# Altium footprint library Pcblib.PcbLib: 281 footprints (part 15 of 18)
Each footprint in its own frame and in the unit in brackets; x right, y up, seen from the top. Pads: shape width x height; smd on the part's side, far side on the other; paste and mask are expansions set on the pad; w line width, h text height; cw(c..) or ccw(c..) is an arc to the next point about the centre after c.
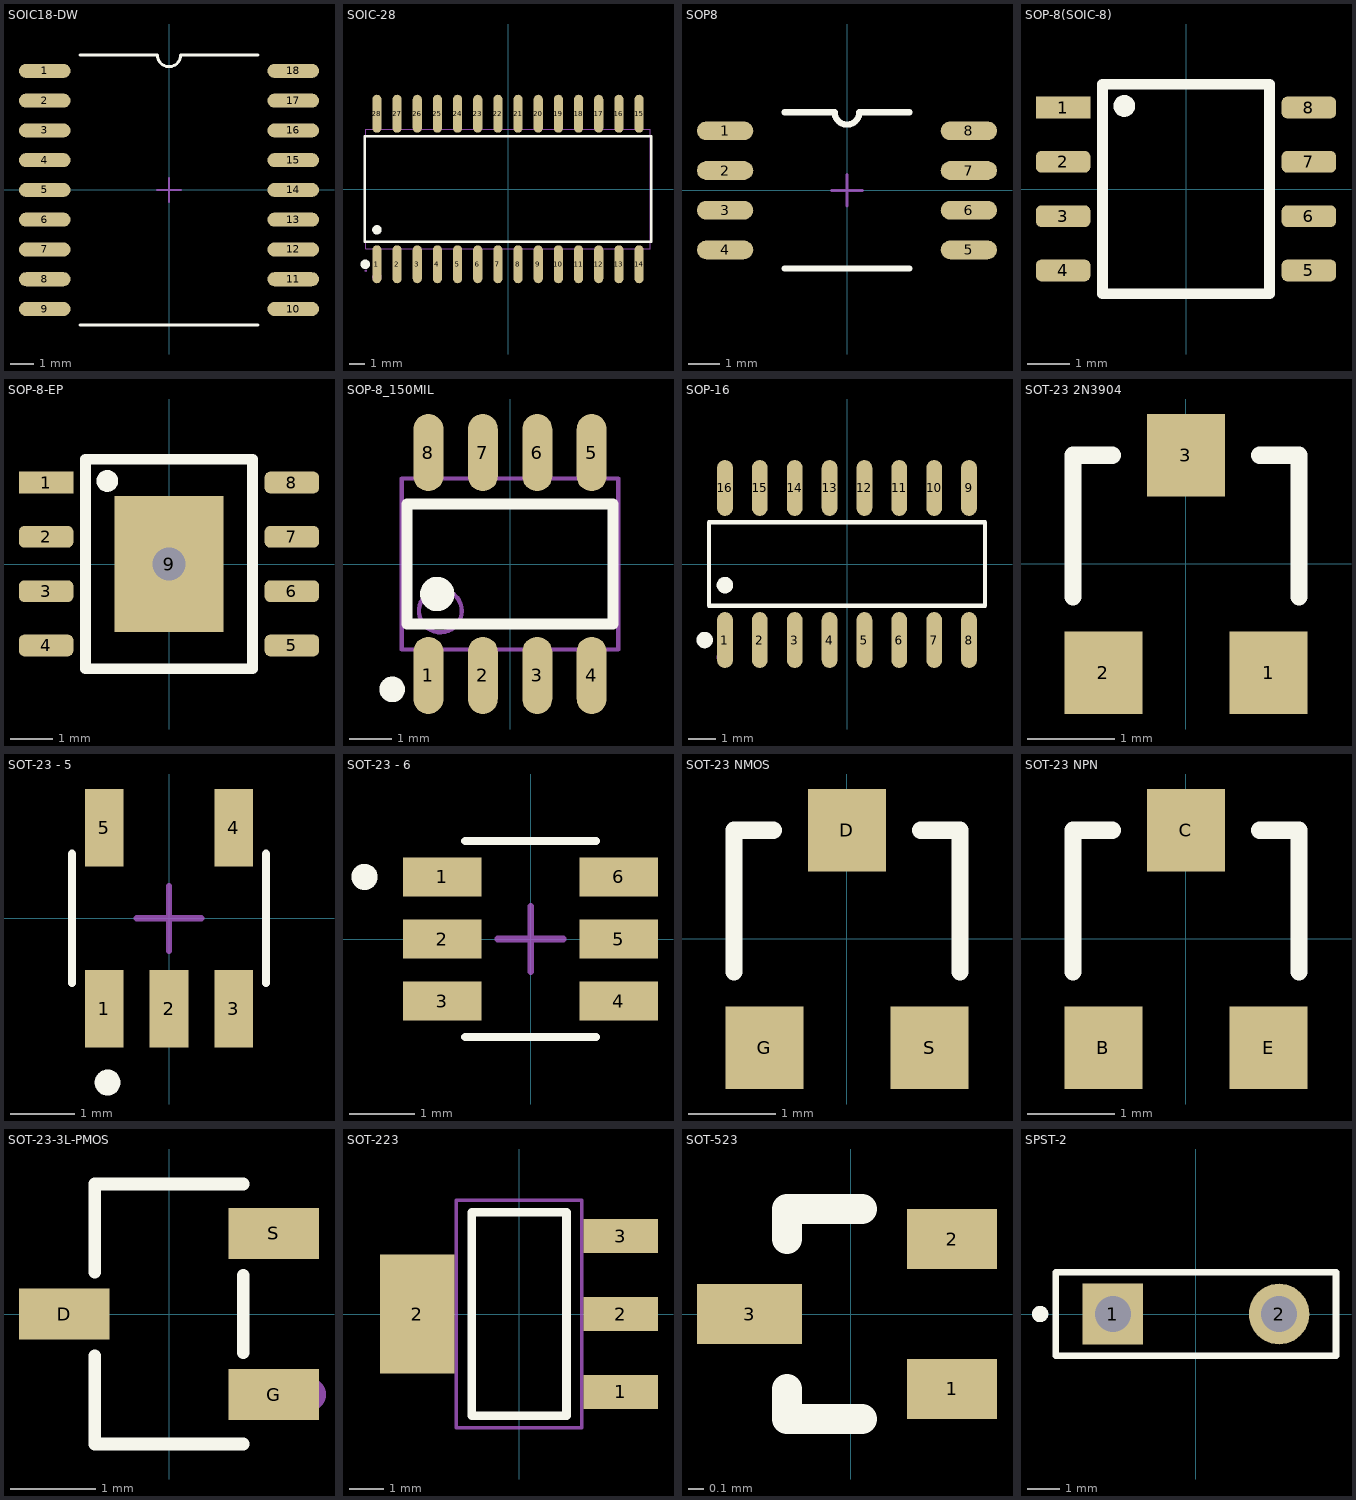
[diagram p14: the footprints below, top view; thin cyan lines are the x and y axes]

## SOIC18-DW [mm]
height 2.3
pads (18):
  oval 2.2x0.6 smd: 1(-5.3,5.08) 2(-5.3,3.81) 3(-5.3,2.54) 4(-5.3,1.27) 5(-5.3,0) 6(-5.3,-1.27) 7(-5.3,-2.54) 8(-5.3,-3.81) 9(-5.3,-5.08) 10(5.3,-5.08) 11(5.3,-3.81) 12(5.3,-2.54) 13(5.3,-1.27) 14(5.3,0) 15(5.3,1.27) 16(5.3,2.54) 17(5.3,3.81) 18(5.3,5.08)
Top Overlay:
  lines w0.127: -3.8,-5.76 3.8,-5.76 ; -3.8,5.76 -0.5,5.76 ; -0.5,5.765 ccw(c0,5.76) 0.5,5.76 3.8,5.76
Mechanical 15:
  lines w0.1: -0.5,0 0.5,0 ; 0,-0.5 0,0.5
3D body: height 1.35, standoff 0, extent -3.81,-5.76 3.81,5.588

## SOIC-28 [mm]
pads (28):
  oval 0.574x2.388 smd mask+0.051: 1(-8.255,-4.744) 2(-6.985,-4.744) 3(-5.715,-4.744) 4(-4.445,-4.744) 5(-3.175,-4.744) 6(-1.905,-4.744) 7(-0.635,-4.744) 8(0.635,-4.744) 9(1.905,-4.744) 10(3.175,-4.744) 11(4.445,-4.744) 12(5.715,-4.744) 13(6.985,-4.744) 14(8.255,-4.744) 15(8.255,4.744) 16(6.985,4.744) 17(5.715,4.744) 18(4.445,4.744) 19(3.175,4.744) 20(1.905,4.744) 21(0.635,4.744) 22(-0.635,4.744) 23(-1.905,4.744) 24(-3.175,4.744) 25(-4.445,4.744) 26(-5.715,4.744) 27(-6.985,4.744) 28(-8.255,4.744)
Top Overlay:
  circle w0.3: c-8.994,-4.744 r0.15
  circle w0.3: c-8.255,-2.569 r0.15
  lines w0.152: -9.026,-3.321 9.026,-3.321 9.026,3.321 -9.026,3.321 -9.026,-3.321
Mechanical 6:
  circle w0.3: c-8.255,-5.55 r0.15
Mechanical 15:
  drawing of 61 lines, arcs and shapes, not listed

## SOP8 [mm]
height 1.45
pads (8):
  oval 1.8x0.6 smd: 1(-3.9,1.905) 2(-3.9,0.635) 3(-3.9,-0.635) 4(-3.9,-1.905) 5(3.9,-1.905) 6(3.9,-0.635) 7(3.9,0.635) 8(3.9,1.905)
Top Overlay:
  lines w0.2: -2,-2.5 2,-2.5 ; -2,2.5 -0.394,2.5 ccw(c0,2.5) 0.394,2.5 2,2.5
Mechanical 15:
  lines w0.1: -0.5,0 0.5,0 ; 0,-0.5 0,0.5
3D body: height 1.2, standoff 0, extent -2.667,-2.413 2.667,2.413

## SOP-8(SOIC-8) [mil]
height 220.47
pads (8):
  rect 50x20 smd: 1(-113.11,75)
  rrect50% 50x20 smd: 2(-113.11,25) 3(-113.11,-25) 4(-113.11,-75) 5(113.11,-75) 6(113.11,-25) 7(113.11,25) 8(113.11,75)
Top Overlay:
  circle w10: c-56.77,76.46 r5
  lines w10: -76.77,-96.46 76.77,-96.46 76.77,96.46 -76.77,96.46 -76.77,-96.46
3D body: height 66.93, standoff 0, extent -118.11,-96.46 118.11,96.46

## SOP-8-EP [mil]
pads (9):
  rect 50x20 smd: 1(-113.11,75)
  rrect50% 50x20 smd: 2(-113.11,25) 3(-113.11,-25) 4(-113.11,-75) 5(113.11,-75) 6(113.11,-25) 7(113.11,25) 8(113.11,75)
  rect 100x125 smd: 9(0,0)
via 0,0 diameter 40 hole 30
Top Overlay:
  circle w10: c-56.77,76.46 r5
  lines w10: -76.77,-96.46 -76.77,96.46 76.77,96.46 76.77,-96.46 -76.77,-96.46
3D body "SOP-8-EP.step": height 66.93, standoff 0, extent -118.11,-96.46 118.11,96.46

## SOP-8_150MIL [mm]
pads (8):
  oval 0.7x1.8 smd: 1(-1.905,-2.6) 2(-0.635,-2.6) 3(0.635,-2.6) 4(1.905,-2.6) 5(1.905,2.6) 6(0.635,2.6) 7(-0.635,2.6) 8(-1.905,2.6)
Top Overlay:
  circle w0.3: c-2.75,-2.925 r0.15
  circle w0.4: c-1.7,-0.7 r0.2
  lines w0.254: -2.4,-1.4 2.4,-1.4 2.4,1.4 -2.4,1.4 -2.4,-1.4
Mechanical 13:
  circle w0.1: c-1.625,-1.095 r0.5
  lines w0.1: -2.525,-1.995 2.525,-1.995 2.525,1.995 -2.525,1.995 -2.525,-1.995
3D body "User Library-SOIC-8-150.STEP": height 1.75, standoff 0, extent -2.5,-3.1 2.5,3.1

## SOP-16 [mm]
pads (16):
  oval 0.574x2.038 smd: 1(-4.445,-2.769) 2(-3.175,-2.769) 3(-1.905,-2.769) 4(-0.635,-2.769) 5(0.635,-2.769) 6(1.905,-2.769) 7(3.175,-2.769) 8(4.445,-2.769) 9(4.445,2.769) 10(3.175,2.769) 11(1.905,2.769) 12(0.635,2.769) 13(-0.635,2.769) 14(-1.905,2.769) 15(-3.175,2.769) 16(-4.445,2.769)
Top Overlay:
  circle w0.3: c-4.445,-0.769 r0.15
  circle w0.3: c-5.184,-2.769 r0.15
  lines w0.152: -5.026,-1.521 5.026,-1.521 5.026,1.521 -5.026,1.521 -5.026,-1.521
Mechanical 15:
  circle w0.3: c-4.445,-3.4 r0.15

## SOT-23 2N3904 [mm] "SOT-23; 3 Leads; Body 3.0 x 2.6 mm, inc. leads (LxW max)"
height 1.1
pads (3):
  rect 0.9x0.95 smd: 1(0.95,-1.25) 2(-0.95,-1.25) 3(0,1.25)
Top Overlay:
  lines w0.2: -1.3,-0.375 -1.3,1.25 -0.85,1.25 ; 0.85,1.25 1.3,1.25 1.3,-0.375

## SOT-23 - 5 [mm]
pads (5):
  rect 0.6x1.2 smd: 1(-1,-1.4) 2(0,-1.4) 3(1,-1.4) 4(1,1.4) 5(-1,1.4)
Top Overlay:
  circle w0.2: c-0.95,-2.54 r0.1
  lines w0.127: -1.5,-1 -1.5,1 ; 1.5,-1 1.5,1
Mechanical 15:
  lines w0.1: -0.5,0 0.5,0 ; 0,-0.5 0,0.5
3D body: height 1.1, standoff 0, extent 0.762,1.143 1.27,1.397
3D body: height 1.1, standoff 0, extent 0.762,-1.397 1.27,-1.143
3D body: height 1.1, standoff 0, extent -0.254,-1.397 0.254,-1.143
3D body: height 1.1, standoff 0, extent -1.27,-1.397 -0.762,-1.143
3D body: height 1.1, standoff 0, extent -1.27,1.143 -0.762,1.397
3D body: height 1.1, standoff 0, extent -1.397,-1.143 1.397,1.143

## SOT-23 - 6 [mm]
pads (6):
  rect 1.2x0.6 smd: 1(-1.35,0.95) 2(-1.35,0) 3(-1.35,-0.95) 4(1.35,-0.95) 5(1.35,0) 6(1.35,0.95)
Top Overlay:
  circle w0.2: c-2.54,0.95 r0.1
  lines w0.127: -1,-1.5 1,-1.5 ; -1,1.5 1,1.5
Mechanical 15:
  lines w0.1: -0.5,0 0.5,0 ; 0,-0.5 0,0.5
3D body: height 1.1, standoff 0, extent -1.143,-1.397 1.143,1.397
3D body: height 1.1, standoff 0, extent 1.403,-0.254 1.657,0.254
3D body: height 1.1, standoff 0, extent 1.403,-1.27 1.657,-0.762
3D body: height 1.1, standoff 0, extent 1.143,-1.27 1.397,-0.762
3D body: height 1.1, standoff 0, extent -1.397,-1.27 -1.143,-0.762
3D body: height 1.1, standoff 0, extent -1.397,-0.254 -1.143,0.254
3D body: height 1.1, standoff 0, extent -1.397,0.762 -1.143,1.27
3D body: height 1.1, standoff 0, extent 1.143,0.762 1.397,1.27

## SOT-23 NMOS [mm]
height 1.1
pads (3):
  rect 0.9x0.95 smd: D(0,1.25) G(-0.95,-1.25) S(0.95,-1.25)
Top Overlay:
  lines w0.2: -1.3,-0.375 -1.3,1.25 -0.85,1.25 ; 0.85,1.25 1.3,1.25 1.3,-0.375

## SOT-23 NPN [mm] "SOT-23; 3 Leads; Body 3.0 x 2.6 mm, inc. leads (LxW max)"
height 1.1
pads (3):
  rect 0.9x0.95 smd: B(-0.95,-1.25) C(0,1.25) E(0.95,-1.25)
Top Overlay:
  lines w0.2: -1.3,-0.375 -1.3,1.25 -0.85,1.25 ; 0.85,1.25 1.3,1.25 1.3,-0.375

## SOT-23-3L-PMOS [mm]
pads (3):
  rect 1.07x0.6 smd: D(-1.235,0) G(1.235,-0.95) S(1.235,0.95)
Top Overlay:
  lines w0.152: -0.876,-0.495 -0.876,-1.536 0.876,-1.536 ; -0.876,0.495 -0.876,1.536 0.876,1.536 ; 0.876,-0.455 0.876,0.455
Mechanical 15:
  circle w0.2: c1.651,-0.95 r0.1

## SOT-223 [mm]
pads (4):
  rect 2.2x1 smd: 1(3,-2.3) 2(3,0) 3(3,2.3)
  rect 2.2x3.5 smd: 2(-3,0)
Top Overlay:
  lines w0.254: -1.4,-3 1.4,-3 1.4,3 -1.4,3 -1.4,-3
Mechanical 13:
  lines w0.1: -1.85,-3.35 -1.85,3.35 1.85,3.35 1.85,-3.35 -1.85,-3.35
3D body "TO-223.STEP": height 1.64, standoff -0.04, extent -3.49,-3.242 3.49,3.243

## SOT-523 [mm]
pads (3):
  rect 0.6x0.4 smd: 1(0.675,-0.5) 2(0.675,0.5)
  rect 0.7x0.4 smd: 3(-0.675,0)
Top Overlay:
  lines w0.203: -0.425,-0.5 -0.425,-0.7 0.075,-0.7 ; -0.425,0.5 -0.425,0.7 0.075,0.7
3D body "User Library-SOT-523.STEP": height 0.8, standoff 0, extent -0.825,-0.8 0.775,0.8

## SPST-2 [mm] "Circuit Breaker; 2 Leads"
pads (2):
  rect 1.85x1.85 hole 1.1: 1(-2.54,0)
  round 1.85 hole 1.1: 2(2.54,0)
Top Overlay:
  circle w0.25: c-4.761,-0.001 r0.125
  lines w0.2: -4.28,-1.27 4.28,-1.27 4.28,1.27 -4.28,1.27 -4.28,-1.27